# Altium footprint library PCBLIB.PcbLib: 775 footprints (part 45 of 49)
Each footprint in its own frame and in the unit in brackets; x right, y up, seen from the top. Pads: shape width x height; smd on the part's side, far side on the other; paste and mask are expansions set on the pad; w line width, h text height; cw(c..) or ccw(c..) is an arc to the next point about the centre after c.
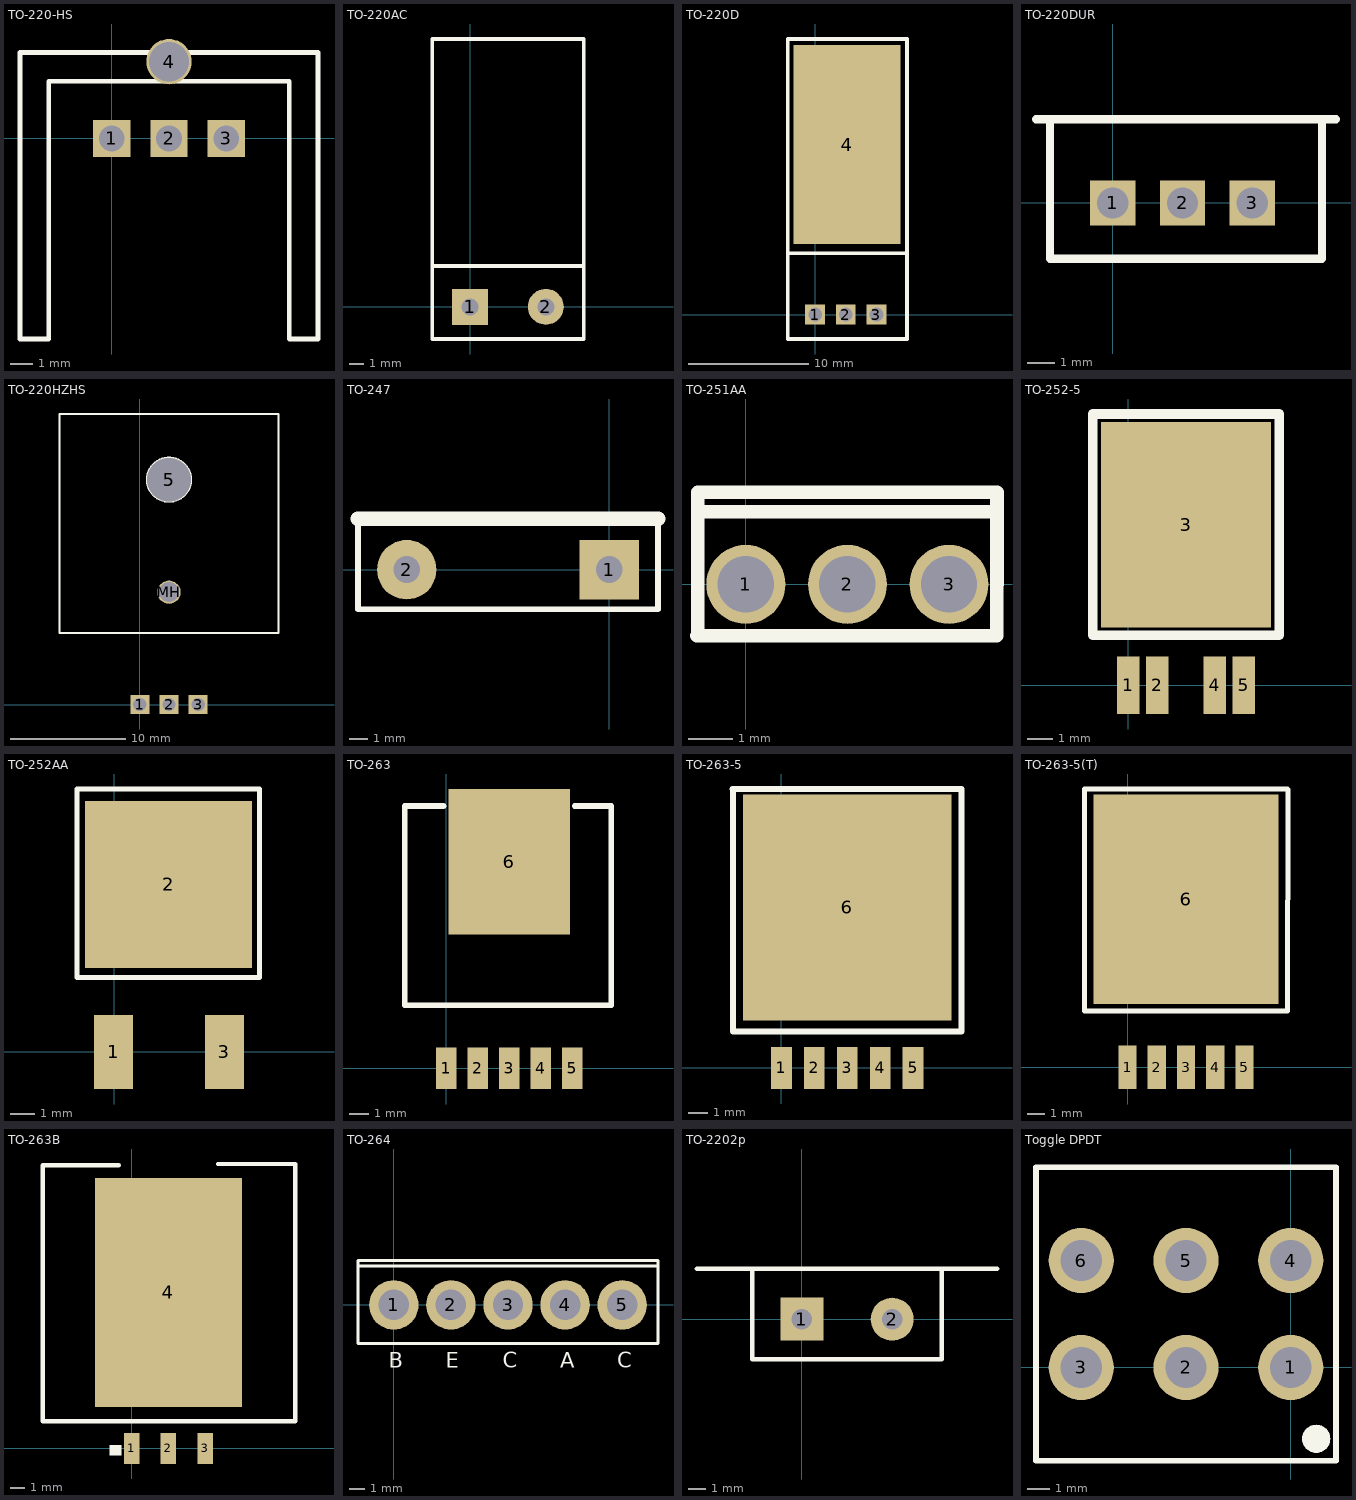
[diagram p44: the footprints below, top view; thin cyan lines are the x and y axes]

## TO-220-HS [mil]
pads (4):
  rect 65x65 hole 45: 1(0,0) 2(100,0) 3(200,0)
  round 79 hole 69: 4(100,134)
TopOverlay:
  lines w8: -160,-350 -110,-350 -110,100 310,100 310,-350 360,-350 360,150 -160,150 -160,-350
Mechanical4:
  text ".100" at 0,0 h1

## TO-220AC [mil]
pads (2):
  rect 95x95 hole 45: 1(0,0)
  round 95 hole 45: 2(200,0)
TopOverlay:
  lines w10: -100,108 -100,708 300,708 300,108 ; -100,108 -100,-85 300,-85 300,108 ; -100,108 300,108
Mechanical4:
  text ".175" at 0,0 h1

## TO-220D [mil]
pads (4):
  rect 65x65 hole 45: 1(0,0) 2(100,0) 3(200,0)
  rect 350x650 smd: 4(104,555)
TopOverlay:
  lines w12: -90,200 300,200 ; -90,-80 -90,900 300,900 300,-80 -90,-80
Mechanical4:
  text ".100" at 0,0 h1

## TO-220DUR [mil]
pads (3):
  rect 65x65 hole 45: 1(0,0) 2(100,0) 3(200,0)
TopOverlay:
  lines w12: -110,120 320,120 ; -90,120 -90,-80 300,-80 300,120
Mechanical4:
  text ".100" at 0,0 h1

## TO-220HZHS [mil]
pads (5):
  rect 65x65 hole 45: 1(0,0) 2(100,0) 3(200,0)
  round 150 hole 150 unplated: 5(100,770)
  round 80 hole 69: MH(100,385)
TopOverlay:
  circle w8: c100,770 r75
  lines w8: -275,245 -275,995 475,995 475,245 -275,245

## TO-247 [mm]
pads (2):
  rect 3.2x3.2 hole 1.45: 1(0,0)
  round 3.2 hole 1.45: 2(-10.9,0)
TopOverlay:
  lines w0.3: -13.525,2.74 -13.525,-2.13 2.625,-2.13 2.625,2.74
  lines w0.8: -13.525,2.74 2.625,2.74

## TO-251AA [mil] "I-PAK"
pads (3):
  round 70 hole 50: 1(0,0) 2(90,0) 3(180,0)
TopOverlay:
  lines w12: -42.5,64.3 221.9,64.3 222.5,64.9 ; 197.72,-45.67 221.8,-45.67 222.4,-45.07 ; 221.75,-45.07 221.15,-45.67 -43.27,-45.67 -42.67,-45.07 -42.67,0.6 -42.5,0 -42.5,81.73 221.9,81.73 222.5,81.13 ; 222.4,-45.67 222.4,0 222.5,0 222.5,81.73

## TO-252-5 [mil]
pads (5):
  rect 35x90 smd: 1(0,0) 2(45,0) 4(135,0) 5(180,0)
  rect 265x320 smd: 3(90,250)
TopOverlay:
  lines w15: -55.45,77.9 235.39,77.9 235.39,422.56 -55.45,422.56 -55.45,77.9

## TO-252AA [mil]
pads (3):
  rect 63x120 smd: 1(-1,0) 3(178,0)
  rect 270x270 smd: 2(88,271)
TopOverlay:
  lines w8: -60,120 -60,425 235,425 235,120 -60,120
Mechanical4:
  text ".075" at 0,0 h1

## TO-263 [mil]
pads (6):
  rect 42x85 smd: 1(0,0) 2(65,0) 3(130,0) 4(195,0) 5(260,0)
  rect 250x300 smd: 6(130,425)
TopOverlay:
  lines w12: -5,540 -85,540 -85,130 340,130 340,540 265,540

## TO-263-5 [mil]
pads (6):
  rect 42x86 smd: 1(0,0) 2(67,0) 3(134,0) 4(201,0) 5(268,0)
  rect 425x460 smd: 6(134,327)
TopOverlay:
  lines w12: -100,568 366,568 ; -99,568 -99,74 367,74 367,568
  text "." at -61,-32 h80
Mechanical4:
  text ".175" at 0,0 h1
  text ".110" at -0.4,0.2 h1

## TO-263-5(T) [mil]
height 6968.5
pads (6):
  rect 42x100 smd: 1(0,0) 2(67,0) 3(134,0) 4(201,0) 5(268,0)
  rect 425x480 smd: 6(134,385)
TopOverlay:
  lines w12: -99,637 -99,129 367,129 368,637 ; -99,638 367,638
  text "." at -61,-32 h80
Mechanical4:
  text ".110" at -0.4,0.2 h1
  text ".175" at 0,0 h1

## TO-263B [mil]
pads (4):
  rect 42x85 smd: 1(0,0) 2(100,0) 3(200,0)
  rect 400x625 smd: 4(100,425)
TopOverlay:
  rectangle: -61,-19 -28,9
  lines w12: -35,772 -242,772 -242,74 445,74 445,775 235,775
Mechanical4:
  text ".175" at 0,0 h1
  text ".110" at -0.4,0.2 h1

## TO-264 [mil]
pads (5):
  round 130 hole 80: 1(0,0) 2(150,0) 3(300,0) 4(450,0) 5(600,0)
TopOverlay:
  lines w8: -94,102 -94,117 694,117 694,102 ; -94,102 694,102 ; -94,102 -94,-102 694,-102 694,102
  text "B" at -13.33,-165 h40
  text "E" at 136.67,-165 h40
  text "C" at 286.67,-165 h40
  text "A" at 436.67,-165 h40
  text "C" at 586.67,-165 h40

## TO-2202p [mil]
pads (2):
  rect 95x95 hole 45: 1(0,0)
  round 95 hole 45: 2(200,0)
TopOverlay:
  lines w10: -232,112 100,112 432,112 ; -110,112 -110,-89 310,-89 310,112
Mechanical4:
  text ".175" at 0,0 h1

## Toggle DPDT [mil]
height 1.13
pads (7):
  round 115 hole 73: 1(0,0) 2(-185,0) 3(-370,0) 4(0,189) 5(-185,189) 6(-370,189)
  round 50 on Top Overlay: ""(45,-126)
TopOverlay:
  lines w10: -450,-165 80,-165 80,354 -450,354 -450,-165
Mechanical4:
  text ".400" at -370,0 h1